# Altium footprint library GyokuRe.PcbLib: 1248 footprints (part 10 of 78)
Each footprint in its own frame and in the unit in brackets; x right, y up, seen from the top. Pads: shape width x height; smd on the part's side, far side on the other; paste and mask are expansions set on the pad; w line width, h text height; cw(c..) or ccw(c..) is an arc to the next point about the centre after c.
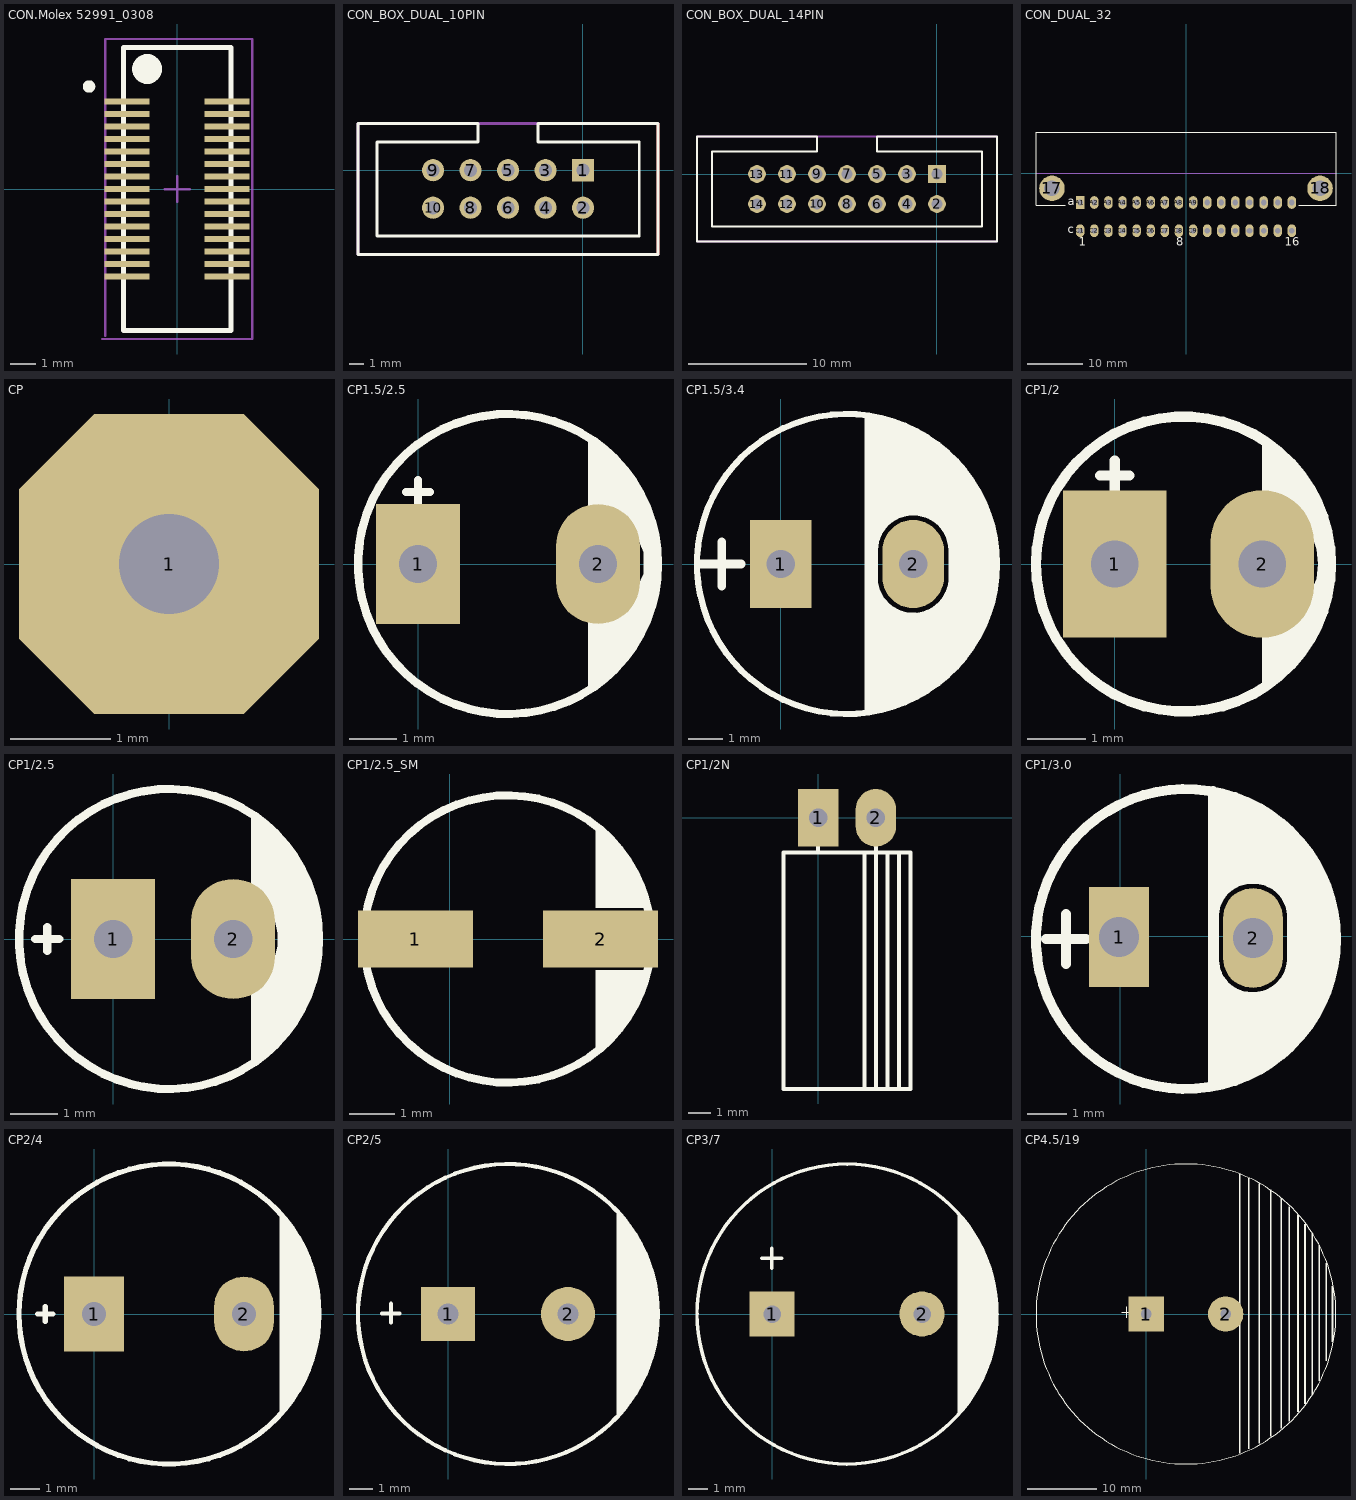
[diagram p9: the footprints below, top view; thin cyan lines are the x and y axes]

## CON.Molex 52991_0308 [mm] "0.50mm (.020\") Pitch SlimStack(TM) Receptacle, Surface Mount, Dual Row, Vertical"
height 2.65
pads (30):
  rect 1.8x0.25 smd: 1(-2,3.5) 2(-2,3) 3(-2,2.5) 4(-2,2) 5(-2,1.5) 6(-2,1) 7(-2,0.5) 8(-2,0) 9(-2,-0.5) 10(-2,-1) 11(-2,-1.5) 12(-2,-2) 13(-2,-2.5) 14(-2,-3) 15(-2,-3.5) 16(2,-3.5) 17(2,-3) 18(2,-2.5) 19(2,-2) 20(2,-1.5) 21(2,-1) 22(2,-0.5) 23(2,0) 24(2,0.5) 25(2,1) 26(2,1.5) 27(2,2) 28(2,2.5) 29(2,3) 30(2,3.5)
Top Overlay:
  circle w0.25: c-3.525,4.1 r0.125
  circle w0.6: c-1.2,4.8 r0.3
  lines w0.2: -2.15,-5.65 -2.15,5.65 2.15,5.65 2.15,-5.65 -2.15,-5.65
Mechanical 15:
  lines w0.1: -3,-6 3,-6 3,6 -2.875,6 -2.873,-5.873 ; -0.5,0 0.5,0 ; 0,-0.5 0,0.5
3D body: height 0.1, standoff 0.01, extent 2.013,-0.1 2.625,0.1
3D body: height 0.1, standoff 0.01, extent 2,0.4 2.612,0.6
3D body: height 0.1, standoff 0.01, extent 2,3.4 2.612,3.6
3D body: height 0.1, standoff 0.01, extent 2,2.9 2.612,3.1
3D body: height 0.1, standoff 0.01, extent 2,2.4 2.612,2.6
3D body: height 0.1, standoff 0.01, extent 2,1.9 2.612,2.1
3D body: height 0.1, standoff 0.01, extent 2,1.4 2.612,1.6
3D body: height 0.1, standoff 0.01, extent 2,0.9 2.612,1.1
3D body: height 0.1, standoff 0.01, extent 2,-0.6 2.612,-0.4
3D body: height 0.1, standoff 0.01, extent 2,-1.1 2.612,-0.9
3D body: height 0.1, standoff 0.01, extent 2,-1.6 2.612,-1.4
3D body: height 0.1, standoff 0.01, extent 2,-2.1 2.612,-1.9
3D body: height 0.1, standoff 0.01, extent 2,-2.6 2.612,-2.4
3D body: height 0.1, standoff 0.01, extent 2,-3.1 2.612,-2.9
3D body: height 0.1, standoff 0.01, extent 2,-3.6 2.612,-3.4
3D body: height 0.1, standoff 0.01, extent -2.6,-0.1 -1.988,0.1
3D body: height 0.1, standoff 0.01, extent -2.612,-3.6 -2,-3.4
3D body: height 0.1, standoff 0.01, extent -2.612,-3.1 -2,-2.9
3D body: height 0.1, standoff 0.01, extent -2.612,-2.6 -2,-2.4
3D body: height 0.1, standoff 0.01, extent -2.612,-2.1 -2,-1.9
3D body: height 0.1, standoff 0.01, extent -2.612,-1.6 -2,-1.4
3D body: height 0.1, standoff 0.01, extent -2.612,-1.1 -2,-0.9
3D body: height 0.1, standoff 0.01, extent -2.612,-0.6 -2,-0.4
3D body: height 0.1, standoff 0.01, extent -2.612,0.4 -2,0.6
3D body: height 0.1, standoff 0.01, extent -2.612,0.9 -2,1.1
3D body: height 0.1, standoff 0.01, extent -2.612,1.4 -2,1.6
3D body: height 0.1, standoff 0.01, extent -2.612,1.9 -2,2.1
3D body: height 0.1, standoff 0.01, extent -2.612,2.4 -2,2.6
3D body: height 0.1, standoff 0.01, extent -2.612,2.9 -2,3.1
3D body: height 0.1, standoff 0.01, extent -2.612,3.4 -2,3.6
3D body: height 1.8, standoff 1.2, extent 0.9,3.4 1.025,3.6
3D body: height 1.8, standoff 1.2, extent 0.9,2.9 1.025,3.1
3D body: height 1.8, standoff 1.2, extent 0.9,2.4 1.025,2.6
3D body: height 1.8, standoff 1.2, extent 0.9,1.9 1.025,2.1
3D body: height 1.8, standoff 1.2, extent 0.9,1.4 1.025,1.6
3D body: height 1.8, standoff 1.2, extent 0.9,0.9 1.025,1.1
3D body: height 1.8, standoff 1.2, extent 0.9,0.4 1.025,0.6
3D body: height 1.8, standoff 1.2, extent 0.9,-0.1 1.025,0.1
3D body: height 1.8, standoff 1.2, extent 0.9,-0.6 1.025,-0.4
3D body: height 1.8, standoff 1.2, extent 0.9,-1.1 1.025,-0.9
3D body: height 1.8, standoff 1.2, extent 0.9,-1.6 1.025,-1.4
3D body: height 1.8, standoff 1.2, extent 0.9,-2.1 1.025,-1.9
3D body: height 1.8, standoff 1.2, extent 0.9,-2.6 1.025,-2.4
3D body: height 1.8, standoff 1.2, extent 0.9,-3.1 1.025,-2.9
3D body: height 1.8, standoff 1.2, extent 0.9,-3.6 1.025,-3.4
3D body: height 1.8, standoff 1.2, extent -1.025,-3.6 -0.9,-3.4
3D body: height 1.8, standoff 1.2, extent -1.025,-3.1 -0.9,-2.9
3D body: height 1.8, standoff 1.2, extent -1.025,-2.6 -0.9,-2.4
3D body: height 1.8, standoff 1.2, extent -1.025,-2.1 -0.9,-1.9
3D body: height 1.8, standoff 1.2, extent -1.025,-1.6 -0.9,-1.4
3D body: height 1.8, standoff 1.2, extent -1.025,-1.1 -0.9,-0.9
3D body: height 1.8, standoff 1.2, extent -1.025,-0.6 -0.9,-0.4
3D body: height 1.8, standoff 1.2, extent -1.025,-0.1 -0.9,0.1
3D body: height 1.8, standoff 1.2, extent -1.025,0.4 -0.9,0.6
3D body: height 1.8, standoff 1.2, extent -1.025,0.9 -0.9,1.1
3D body: height 1.8, standoff 1.2, extent -1.025,1.4 -0.9,1.6
3D body: height 1.8, standoff 1.2, extent -1.025,1.9 -0.9,2.1
3D body: height 1.8, standoff 1.2, extent -1.025,2.4 -0.9,2.6
3D body: height 1.8, standoff 1.2, extent -1.025,2.9 -0.9,3.1
3D body: height 1.8, standoff 1.2, extent -1.025,3.4 -0.9,3.6
3D body: height 2.27, standoff 1, extent -1.917,-4.83 0,4.812
3D body: height 2.27, standoff 1, extent 0,-4.834 1.917,4.809
3D body: height 2.27, standoff 1, extent -0.9,-3.85 0.9,3.85
3D body: height 0.8, standoff 0, extent -3,-6.011 3,6

## CON_BOX_DUAL_10PIN [mm]
pads (10):
  rect 1.5x1.5 hole 0.9: 1(0.003,0.004)
  round 1.5 hole 0.9: 2(0.003,-2.536) 3(-2.537,0.004) 4(-2.537,-2.536) 5(-5.077,0.004) 6(-5.077,-2.536) 7(-7.617,0.004) 8(-7.617,-2.536) 9(-10.157,0.004) 10(-10.157,-2.536)
Top Layer:
  lines w0.2: 5.08,-5.715 5.08,3.175
Top Overlay:
  lines w0.2: -7.109,1.909 -7.109,3.179 -15.237,3.179 -15.237,-5.711 5.083,-5.711 5.083,3.179 -3.045,3.179 -3.045,1.909 ; -7.1,1.909 -13.967,1.909 -13.967,-4.441 3.813,-4.441 3.813,1.91 -3.05,1.91
  text "." at 6.223,1.651 h2.54
Mechanical 13:
  lines w0.2: 5.08,-5.715 -15.24,-5.715 -15.24,3.175 5.08,3.175
3D body "HDB-10.STEP": height 9.3, standoff -2.5, extent -15.145,-6.224 5.055,3.176

## CON_BOX_DUAL_14PIN [mm]
pads (14):
  rect 1.5x1.5 hole 0.9: 1(0.003,0.004)
  round 1.5 hole 0.9: 2(0.003,-2.536) 3(-2.537,0.004) 4(-2.537,-2.536) 5(-5.077,0.004) 6(-5.077,-2.536) 7(-7.617,0.004) 8(-7.617,-2.536) 9(-10.157,0.004) 10(-10.157,-2.536) 11(-12.7,0) 12(-12.7,-2.54) 13(-15.24,0) 14(-15.24,-2.54)
Top Overlay:
  lines w0.2: -20.32,-5.711 5.083,-5.711 5.083,3.179 -5.08,3.179 -5.08,1.91 3.813,1.91 3.813,-4.441 -19.05,-4.441 -19.05,1.909 -10.16,1.909 -10.16,3.179 -20.32,3.179 -20.32,-5.711
  text "." at 6.604,1.524 h2.54
Mechanical 13:
  lines w0.2: -20.32,-5.715 -20.32,3.175 5.08,3.175 5.08,-5.715 -20.32,-5.715
3D body "SW3dPS-HDB-14.STEP": height 9.3, standoff -2.5, extent -20.311,-6.123 4.969,3.277

## CON_DUAL_32 [mm] "Connector; DIN 41612, Type 2C, Thru-Hole; Rows a+c, 32 Position; Right Angle"
height 11.1
pads (34):
  round 4.6 hole 2.8: 17(-24.13,-2.76) 18(24.13,-2.76)
  rect 1.524x2.286 hole 1: A1(-19.05,-5.3)
  oval 1.524x2.286 hole 1: A2(-16.51,-5.3) A3(-13.97,-5.3) A4(-11.43,-5.3) A5(-8.89,-5.3) A6(-6.35,-5.3) A7(-3.81,-5.3) A8(-1.27,-5.3) A9(1.27,-5.3) A10(3.81,-5.3) A11(6.35,-5.3) A12(8.89,-5.3) A13(11.43,-5.3) A14(13.97,-5.3) A15(16.51,-5.3) A16(19.05,-5.3) C1(-19.05,-10.38) C2(-16.51,-10.38) C3(-13.97,-10.38) C4(-11.43,-10.38) C5(-8.89,-10.38) C6(-6.35,-10.38) C7(-3.81,-10.38) C8(-1.27,-10.38) C9(1.27,-10.38) C10(3.81,-10.38) C11(6.35,-10.38) C12(8.89,-10.38) C13(11.43,-10.38) C14(13.97,-10.38) C15(16.51,-10.38) C16(19.05,-10.38)
Top Overlay:
  lines w0.2: -21.75,-5.8 -27,-5.8 -27,7.34 27,7.34 27,-5.8 20.275,-5.8
  text "16" at 17.8,-13.08 h1.5
  text "8" at -1.77,-13.08 h1.5
  text "c" at -21.26,-10.88 h1.5
  text "a" at -21.26,-5.8 h1.5
  text "1" at -19.3,-13.08 h1.5
Mechanical 1:
  lines w0.1: -27,0 27,0
  text "PCB Edge" at -26.15,0.5 h0.6

## CP [mm] "Connect Pad, 1-Pin"
pads (1):
  oct 3x3 hole 1: 1(0,0)

## CP1.5/2.5 [mil] "Tu hoa 33 >100 uF,50V, 220uF/16V,25V ( it su dung )"
height 300
pads (2):
  rect 70x100 hole 32: 1(0,0)
  oval 70x100 hole 32: 2(150,0)
Top Overlay:
  circle w7: c75,0 r125
  region: 142,106 142,39 156,39 173,35 182,25 188,10 188,-8 183,-19 183,-19.53 171,-33 155,-38 142,-41 142,-107 156,-96 177,-72 194,-40 199,-14 200,0 198,24 189,50 175,74 160,93
  lines w7: -10,60 10,60 ; 0,50 0,70
3D body "User Library-Cap 6_3x11.STEP": height 433.67, standoff -747.43, extent -46,-121.02 202.03,127.02

## CP1.5/3.4 [mil] "Tu hoa 220->470uF,16V, 470uF/16V,25V"
height 300
pads (2):
  rect 70x100 hole 32: 1(0,0)
  oval 70x100 hole 32: 2(150,0)
Top Overlay:
  circle w7: c75,0 r170
  region: 100,25 135,60 162.93,60 164.6,59.92 167.88,59.26 170.98,57.98 173.76,56.12 175,55 181.46,48.54 182.26,47.66 183.57,45.69 184.48,43.5 184.94,41.18 185,40 190,35 191.12,33.76 192.98,30.98 194.26,27.88 194.92,24.6 195,22.93 195,-27.93 194.92,-29.6 194.26,-32.88 192.98,-35.98 191.12,-38.76 190,-40 178.54,-51.46 177.66,-52.26 175.69,-53.57 173.5,-54.48 171.18,-54.94 170,-55 168.76,-56.12 165.98,-57.98 162.88,-59.26 159.6,-59.92 157.93,-60 144.14,-60 140.8,-59.84 134.23,-58.53 128.05,-55.97 122.48,-52.25 120,-50 108.54,-38.54 107.74,-37.66 106.43,-35.69 105.52,-33.5 105.06,-31.18 105,-30 100,-30 100,-170 155,-150 195,-120 225,-80 245,-20 245,20 230,70 200,115 165,145 120,165 100,170
  lines w10: -90,0 -45,0 ; -67,-25 -67,25 ; 100,-165 100,165 ; 100,25 105,25 ; 105,-20 105,30 ; 105,-10 ccw(c150,-15) 145,-60 ccw(c150,-15) 195,-20 195,15 ccw(c150,15) 150,60 ccw(c150,15) 105,15
3D body "User Library-CAP 8X11_5.STEP": height 445.89, standoff -754.41, extent -84.96,-157.48 230,157.48

## CP1/2 [mil] "Tu hoa < 22uF/16>50V"
height 300
pads (2):
  rect 70x100 hole 32: 1(0,0)
  oval 70x100 hole 32: 2(100,0)
Top Overlay:
  circle w7: c46.58,0 r100
  region: 100,84 100,38 112,36 122,32 129,27 134,19 137,10 138,0 137,-10 134,-17 129,-24 123,-31 117,-35 107,-38 100,-38 100,-85 108,-78 120,-69 128,-59 137,-44 144,-19 146,9 139,40 127,60 110,79
  lines w7: -10,60 10,60 ; 0,50 0,70
3D body "User Library-Cap electro 5x7x2mm.STEP": height 287.03, standoff -138.05, extent -49.42,-99.42 149.42,99.42

## CP1/2.5 [mil] "Tu hoa 33 >100 uF,50V, 220uF/16V,25V"
height 300
pads (2):
  rect 70x100 hole 32: 1(0,0)
  oval 70x100 hole 32: 2(100,0)
Top Overlay:
  circle w7: c46.58,0 r125
  region: 115,105 115,36 122,31 129,25 133,20 135,15 137,5 137,-6 135,-14 132,-19 128,-24 124,-28 120,-31 115,-34 115,-107 124,-99 139,-86 152,-69 167,-36 171,-15 171.58,0 167,30 153,67 131,93
  lines w7: -65,0 -45,0 ; -55,-10 -55,-5 -55,5 -55,10
3D body "User Library-Cap 6_3x11.STEP": height 421.54, standoff -759.57, extent -76,-124.03 172.03,124

## CP1/2.5_SM [mil] "Tu hoa SMD 33 >100 uF,50V, 220uF/16V,25V"
height 100
pads (2):
  rect 100x50 smd: 1(-30,0) 2(131,0)
Top Overlay:
  circle w7: c50,0 r125
  region: 127,98 127,27 172,27 173,9 170,-26 169.75,-27 127,-27 127,-98 141,-86 156,-67 170,-38 175,-19 175,18 170,37 162,58 146,82
  lines w7: -65,0 -45,0 ; -55,-10 -55,-5 -55,5 -55,10

## CP1/2N [mil] "Tu hoa < 22uF/16>50V"
height 300
pads (2):
  rect 70x100 hole 32: 1(0,0)
  oval 70x100 hole 32: 2(100,0)
Top Overlay:
  lines w7: 0,-60 0,-45 ; 80,-470 80,-60 ; 100,-470 100,-60 100,-45 ; 120,-470 120,-60 ; 140,-470 140,-60 ; -60,-470 160,-470 160,-60 -60,-60 -60,-470
3D body "User Library-Cap electro 5x7x2mm RA.STEP": height 199.43, standoff -136.22, extent -54.42,-351.27 144.43,15.7

## CP1/3.0 [mil]
pads (2):
  rect 60x100 hole 40: 1(-1,-1)
  oval 60x100 hole 40: 2(133,-2)
Top Overlay:
  circle w10: c66,-3 r150
  region: 93,146 93,37 121,58 143,58 165,42 174,-3 166,-43 141,-62 106,-53 92,-36 93,-150 152,-128 208,-60 216,16 185,93 139,129
  lines w10: -74,-3 -34,-3 ; -54,-28 -54,22 ; 93,-147 93,145 ; 94,-27 94,22 cw(c131.5,19.5) 131.01,57.08 ; 94,-25 ccw(c131.5,-23.5) 133,-61 ccw(c133.5,-22.5) 172,-23 ; 131,57 cw(c134,19) 172,22 ; 172,-30 172,25
3D body "User Library-CAP 8X11_5.STEP": height 452.87, standoff -747.43, extent -90,-162.48 224.96,152.48

## CP2/4 [mil] "Tu hoa 1000uF/16V/25V"
height 400
pads (2):
  rect 80x100 hole 32: 1(0,0)
  oval 80x100 hole 32: 2(200,0)
Top Overlay:
  circle w7: c100,0 r200
  region: 248,133 248,-134 262,-117 274,-97 284,-81 293,-55 299,-21 298,21 296,46 281,85 258,122
  lines w7: -75,0 -55,0 ; -65,-10 -65,10

## CP2/5 [mil] "Tu hoa 1000uF/25V,50V"
height 600
pads (2):
  rect 90x90 hole 35: 1(0,0)
  round 90 hole 35: 2(200,0)
Top Overlay:
  circle w7: c100,0 r250
  region: 281,174 281,-175 300,-149 301,-151 318,-124 334,-90 349,-29 350,0 348,34 341,70 321,116
  lines w7: -110,1 -81,1 ; -95,-14 -95,17
3D body "User Library-Cap12_5x25.STEP": height 984.37, standoff -747.43, extent -141.06,-247.12 351.06,245

## CP3/7 [mil] "Tu hoa 4700uF/25V"
height 600
pads (2):
  rect 90x90 hole 35: 1(0,0)
  round 90 hole 35: 2(300,0)
Top Overlay:
  circle w7: c150,0 r300
  region: 425,112 433,96 442,79 447,39 450,-9 449,-34 442,-69 429,-115 397,-171 382,-191 371,-203 371,200 384.5,182.5 395,168 408,153
  lines w7: -21,112 19,112 ; -1,92 -1,132

## CP4.5/19 [mil] "Tu hoa 10,000uF/63V"
height 600
pads (2):
  rect 200x200 hole 60: 1(0,0)
  round 200 hole 60: 2(450,0)
Top Overlay:
  circle w7: c225,0 r850
  rectangle: 525,-790 535,795
  rectangle: 575,-765 585,770
  rectangle: 635,-735 645,740
  rectangle: 700,-695 710,705
  rectangle: 1050,-160 1060,160
  rectangle: 1015,-265 1025,290
  rectangle: 760,-650 770,655
  rectangle: 805,-610 815,610
  rectangle: 855,-555 865,560
  rectangle: 895,-510 905,510
  rectangle: 935,-455 945,455
  rectangle: 975,-380 985,390
  lines w7: -140,10 -80,10 ; -110,-20 -110,40